# Altium footprint library FOOTPRINT.PcbLib: 132 footprints (part 3 of 9)
Each footprint in its own frame and in the unit in brackets; x right, y up, seen from the top. Pads: shape width x height; smd on the part's side, far side on the other; paste and mask are expansions set on the pad; w line width, h text height; cw(c..) or ccw(c..) is an arc to the next point about the centre after c.
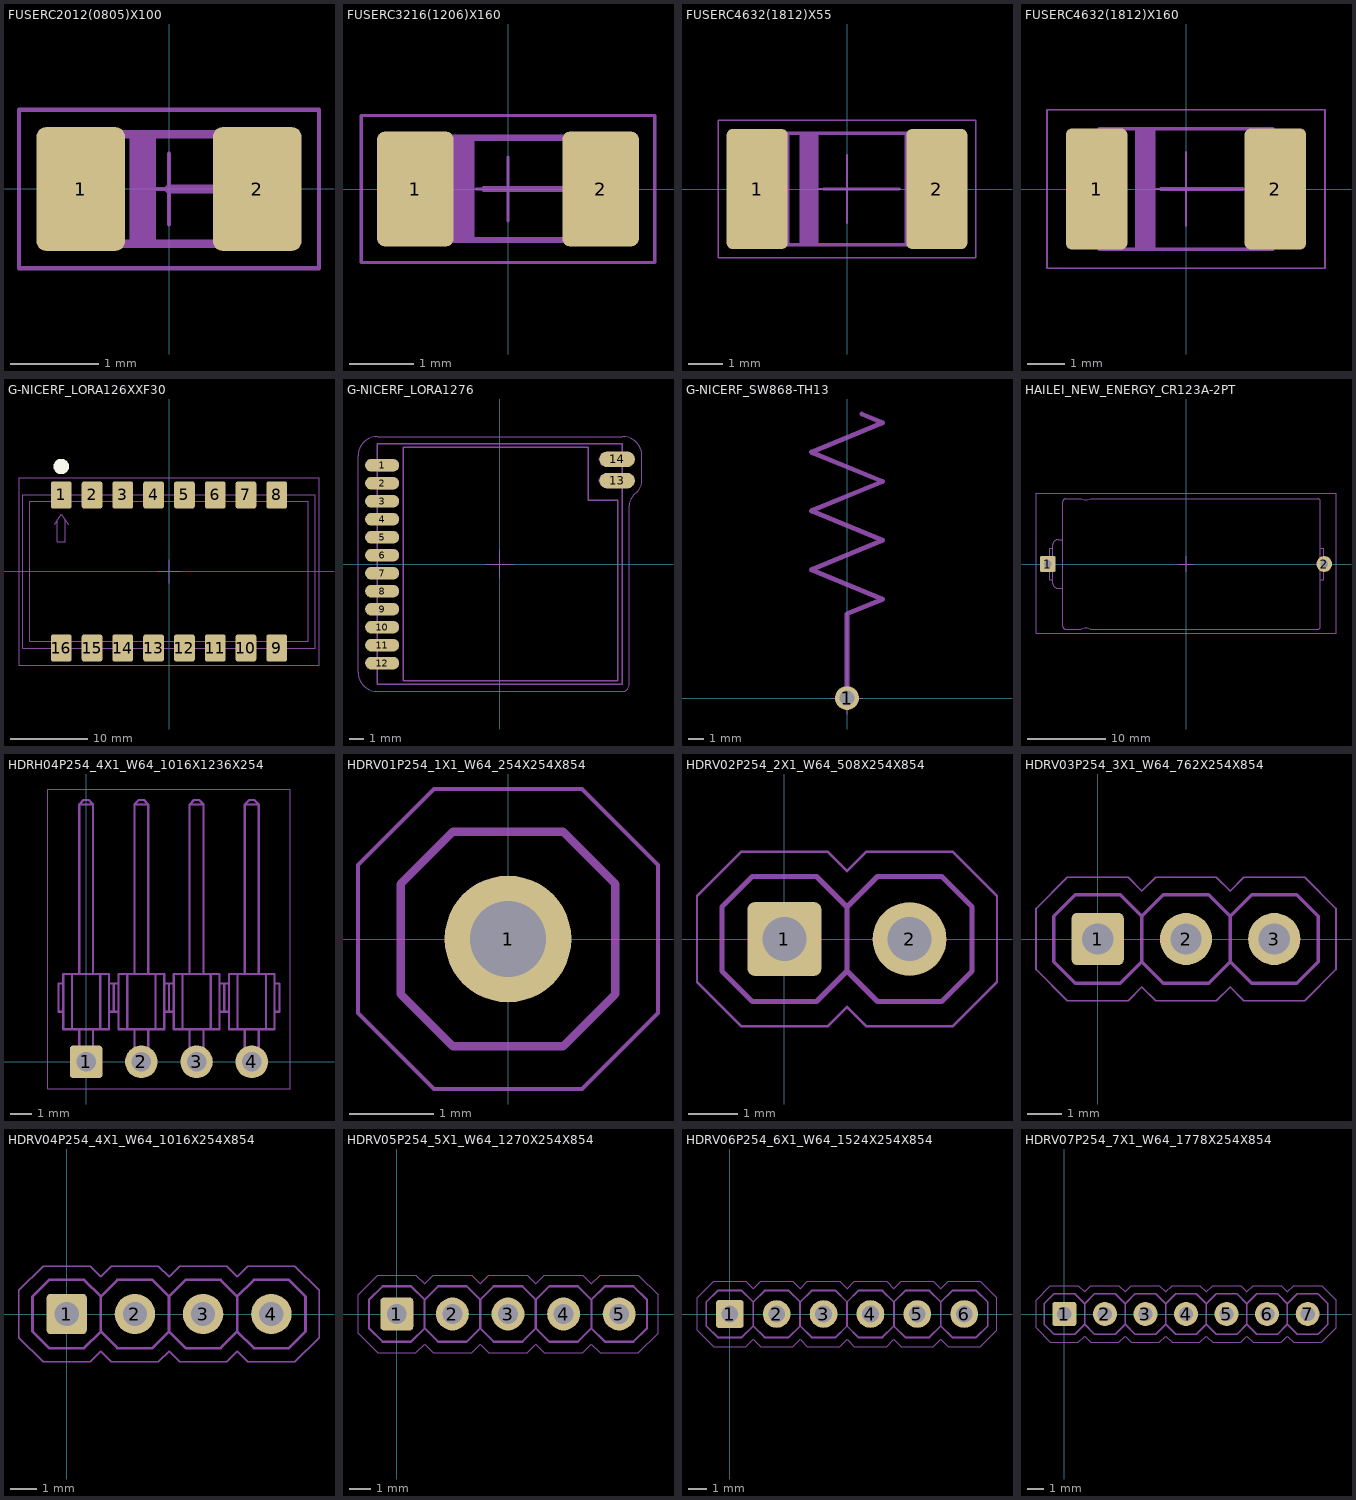
[diagram p2: the footprints below, top view; thin cyan lines are the x and y axes]

## FUSERC2012(0805)X100 [mm] "Fuse Resettable, Body 2.00x1.20mm"
height 1
pads (2):
  rrect20% 1x1.4 smd: 1(-1,0) 2(1,0)
Top Assembly:
  region: 1.02,0.62 0.65,0.62 0.65,-0.62 1.02,-0.62
  rectangle: -1.02,-0.62 -0.65,0.62
  rectangle: -0.45,-0.625 -0.15,0.62
  lines w0.1: 0,0 0.5,0 ; -1.02,-0.62 1.02,-0.62 1.02,0.62 -1.02,0.62 -1.02,-0.62
Top Courtyard:
  lines w0.05: -1.7,-0.9 1.7,-0.9 1.7,0.9 -1.7,0.9 -1.7,-0.9
Top Component Center:
  lines w0.05: -0.4,0 0.4,0 -0.4,0 ; 0,-0.4 0,0.4 0,-0.4
Top Designator:
  text "'.Designator'" at -0.55,0.126 h0.65
  text "'.Comment'" at -0.55,-0.535 h0.65
3D body "FUSERC_FUSERC2012(0805)X100.x_t": height 1.02, standoff -0.02, extent -1.02,-0.62 1.02,0.62

## FUSERC3216(1206)X160 [mm] "Fuse Resettable, Body 3.20x1.60mm"
height 1.6
pads (2):
  rrect20% 1.2x1.8 smd: 1(-1.45,0) 2(1.45,0)
Top Assembly:
  region: 1.6,0.8 1.15,0.8 1.15,-0.8 1.6,-0.8
  region: -1.15,0.8 -1.6,0.8 -1.6,-0.8 -1.15,-0.8
  rectangle: -0.875,-0.8 -0.525,0.8
  lines w0.1: -0.375,0 1,0 ; -1.6,-0.8 -1.6,0.8 1.6,0.8 1.6,-0.8 -1.6,-0.8
Top Courtyard:
  lines w0.05: -2.3,-1.15 -2.3,1.15 2.3,1.15 2.3,-1.15 -2.3,-1.15
Top Component Center:
  lines w0.05: -0.5,0 0.5,0 ; 0,-0.5 0,0.5
Top Designator:
  text "'.Designator'" at -0.5,0.076 h0.65
  text "'.Comment'" at -0.45,-0.66 h0.65
3D body "FUSERC_FUSERC3216(1206)X160.x_t": height 1.62, standoff -0.02, extent -1.62,-0.82 1.62,0.82

## FUSERC4632(1812)X55 [mm] "Fuse Resettable, Body 4.60x3.20mm"
height 0.55
pads (2):
  rrect20% 1.78x3.5 smd: 1(-2.615,0) 2(2.615,0)
Top Assembly:
  region: 2.32,1.62 1.675,1.62 1.675,-1.62 2.32,-1.62
  region: -1.675,1.62 -2.32,1.62 -2.32,-1.62 -1.675,-1.62
  rectangle: -1.375,-1.62 -0.825,1.625
  lines w0.1: -0.675,0 1.525,0 ; -2.32,-1.62 -2.32,1.62 2.32,1.62 2.32,-1.62 -2.32,-1.62
Top Courtyard:
  lines w0.05: -3.75,-2 3.75,-2 3.75,2 -3.75,2 -3.75,-2
Top Component Center:
  lines w0.05: -1,0 1,0 ; 0,-1 0,1
Top Designator:
  text "'.Comment'" at -0.725,-0.635 h0.65
  text "'.Designator'" at -0.725,0.276 h0.65
3D body "FUSERC_FUSERC4632(1812)X55.x_t": height 0.57, standoff -0.02, extent -2.32,-1.62 2.32,1.62

## FUSERC4632(1812)X160 [mm] "Fuse Resettable, Body 4.60x3.20mm"
height 1.6
pads (2):
  rrect20% 1.65x3.25 smd: 1(-2.4,0) 2(2.4,0)
Top Assembly:
  rectangle: -1.375,-1.62 -0.825,1.625
  region: -1.675,1.62 -2.32,1.62 -2.32,-1.62 -1.675,-1.62
  region: 2.32,1.62 1.675,1.62 1.675,-1.62 2.32,-1.62
  lines w0.1: -0.675,0 1.525,0 ; -2.32,-1.62 -2.32,1.62 2.32,1.62 2.32,-1.62 -2.32,-1.62
Top Courtyard:
  lines w0.05: -3.725,-2.125 3.725,-2.125 3.725,2.125 -3.725,2.125 -3.725,-2.125
Top Component Center:
  lines w0.05: -1,0 1,0 ; 0,-1 0,1
Top Designator:
  text "'.Comment'" at -0.975,-0.635 h0.65
  text "'.Designator'" at -0.975,0.276 h0.65
3D body "FUSERC_FUSERC4632(1812)X160.x_t": height 1.65, standoff 0.01, extent -2.32,-1.62 2.32,1.62

## G-NICERF_LORA126XXF30 [mm] "RF-Module, Body 38.0x20.0mm"
pads (16):
  rrect20% 2.7x3.5 smd: 1(-14,9.95) 2(-10,9.95) 3(-6,9.95) 4(-2,9.95) 5(2,9.95) 6(6,9.95) 7(10,9.95) 8(14,9.95) 9(14,-9.95) 10(10,-9.95) 11(6,-9.95) 12(2,-9.95) 13(-2,-9.95) 14(-6,-9.95) 15(-10,-9.95) 16(-14,-9.95)
Top Overlay:
  circle w1: c-14,13.65 r0.5
Top Assembly:
  lines w0.1: -14.875,6.125 -14,7.45 -13.125,6.125 ; -14.5,6.7 -14.5,3.85 -13.5,3.85 -13.5,6.7 ; -19,-10 19,-10 19,10 -19,10 -19,-10 ; -18.1,-9.1 18.1,-9.1 18.1,9.1 -18.1,9.1 -18.1,-9.1
Top Courtyard:
  lines w0.05: -19.5,-12.2 -15.35,-12.2 19.5,-12.2 19.5,-10 19.5,12.2 -19.5,12.2 -19.5,-10 -19.5,-12.2
Top Component Center:
  lines w0.05: -1.5,0 1.5,0 ; 0,-1.5 0,1.5
Top Designator:
  text "'.Designator'" at -1.6,0.176 h0.65
  text "'.Comment'" at -1.6,-0.435 h0.65
3D body: height 0.95, standoff 0, extent -19,-10 19,10
3D body: height 4, standoff 0.95, extent -18.1,-9.1 18.1,9.1

## G-NICERF_LORA1276 [mm] "RF-Module, Body 17.0x17.3mm"
height 2.62
pads (14):
  oval 2.4x0.9 smd: 1(-8.3,6.97) 2(-8.3,5.7) 3(-8.3,4.43) 4(-8.3,3.16) 5(-8.3,1.89) 6(-8.3,0.62) 7(-8.3,-0.65) 8(-8.3,-1.92) 9(-8.3,-3.19) 10(-8.3,-4.46) 11(-8.3,-5.73) 12(-8.3,-7)
  oval 2.5x1.1 smd: 13(8.3,5.89) 14(8.3,7.39)
Top Assembly:
  circle w0.1: c7.625,5.9 r0.3
  circle w0.1: c-7.675,1.895 r0.206
  circle w0.1: c-7.675,-1.915 r0.206
  circle w0.1: c7.625,7.4 r0.3
  circle w0.1: c-7.675,6.975 r0.206
  circle w0.1: c-7.675,5.705 r0.206
  circle w0.1: c-7.675,4.435 r0.206
  circle w0.1: c-7.675,3.165 r0.206
  circle w0.1: c-7.675,0.625 r0.206
  circle w0.1: c-7.675,-0.645 r0.206
  circle w0.1: c-7.675,-3.185 r0.206
  circle w0.1: c-7.675,-4.455 r0.206
  circle w0.1: c-7.675,-5.725 r0.206
  circle w0.1: c-7.675,-6.995 r0.206
  lines w0.1: -8.65,-7.37 -7.525,-7.37 ccw(c-7.524,-6.995) -7.525,-6.62 -8.65,-6.62 ; -8.65,-6.1 -7.525,-6.1 ccw(c-7.524,-5.725) -7.525,-5.35 -8.65,-5.35 ; -8.65,-4.83 -7.525,-4.83 ccw(c-7.524,-4.455) -7.525,-4.08 -8.65,-4.08 ; -8.65,-3.56 -7.525,-3.56 ccw(c-7.524,-3.185) -7.525,-2.81 -8.65,-2.81 ; -8.65,-2.29 -7.525,-2.29 ccw(c-7.524,-1.915) -7.525,-1.54 -8.65,-1.54 ; -8.65,-1.02 -7.525,-1.02 ccw(c-7.524,-0.645) -7.525,-0.27 -8.65,-0.27 ; -8.65,0.25 -7.525,0.25 ccw(c-7.524,0.625) -7.525,1 -8.65,1 ; -8.65,1.52 -7.525,1.52 ccw(c-7.524,1.895) -7.525,2.27 -8.65,2.27 ; -8.65,2.79 -7.525,2.79 ccw(c-7.524,3.165) -7.525,3.54 -8.65,3.54 ; -8.65,4.06 -7.525,4.06 ccw(c-7.524,4.435) -7.525,4.81 -8.65,4.81 ; -8.65,5.33 -7.525,5.33 ccw(c-7.524,5.705) -7.525,6.08 -8.65,6.08 ; -8.65,6.6 -7.525,6.6 ccw(c-7.524,6.975) -7.525,7.35 -8.65,7.35 ; -8.633,-7.37 ccw(c-8.75,-6.995) -8.633,-6.62 ; -8.633,-6.1 ccw(c-8.75,-5.725) -8.633,-5.35 ; -8.633,-4.83 ccw(c-8.75,-4.455) -8.633,-4.08 ; -8.633,-3.56 ccw(c-8.75,-3.185) -8.633,-2.81 ; -8.633,-2.29 ccw(c-8.75,-1.915) -8.633,-1.54 ; -8.633,-1.02 ccw(c-8.75,-0.645) -8.633,-0.27 ; -8.633,0.25 ccw(c-8.75,0.625) -8.633,1 ; -8.633,1.52 ccw(c-8.75,1.895) -8.633,2.27 ; -8.633,2.79 ccw(c-8.75,3.165) -8.633,3.54 ; -8.633,4.06 ccw(c-8.75,4.435) -8.633,4.81 ; -8.633,5.33 ccw(c-8.75,5.705) -8.633,6.08 ; -8.633,6.6 ccw(c-8.75,6.975) -8.633,7.35 ; 8.603,5.424 cw(c8.75,5.895) 8.603,6.366 ; 8.603,6.924 cw(c8.75,7.395) 8.603,7.866 ; 8.65,5.42 7.525,5.42 cw(c7.523,5.895) 7.525,6.37 8.65,6.37 ; 8.65,6.92 7.525,6.92 cw(c7.523,7.395) 7.525,7.87 8.65,7.87 ; -8.65,-8.5 8.65,-8.5 8.65,8.5 -8.65,8.5 -8.65,-8.5 ; -6.8,-8.25 8.35,-8.25 8.35,4.5 6.25,4.5 6.25,8.25 -6.8,8.25 -6.8,-8.25
Top Courtyard:
  lines w0.05: 8.65,-9 -8.65,-9 cw(c-8.65,-7.65) -10,-7.65 -10,7.65 cw(c-8.65,7.65) -8.65,9 8.7,9 cw(c8.7,7.65) 10.05,7.65 10.05,5.875 cw(c9.028,5.873) 9.75,5.15 9.45,4.838 ccw(c10.165,4.117) 9.15,4.125 9.15,-8.5 cw(c8.65,-8.5) 8.65,-9
Top Component Center:
  lines w0.05: -1,0 1,0 ; 0,-1 0,1
Top Designator:
  text "'.Comment'" at -1.2,-0.977 h0.65
  text "'.Designator'" at -1.2,0.676 h0.65
3D body "G-NiceRF -  LoRa1276.x_t": height 2.63, standoff 0.01, extent -8.65,-8.5 8.65,8.5

## G-NICERF_SW868-TH13 [mm] "Antenna, 868MHz"
height 3.6
pads (1):
  round 1.5 hole 0.95: 1(0,0)
Top Assembly:
  lines w0.3: 0,0 0,5.3 2.25,6.225 -2.25,8.075 2.25,9.925 -2.25,11.775 2.25,13.625 -2.25,15.475 2.25,17.325 0.923,17.87
Top Component Center:
  lines w0.05: -1,0 1,0 ; 0,-1 0,1
Top Designator:
  text "'.Comment'" at 0.75,1.973 h0.65
  text "'.Designator'" at 0.75,3.626 h0.65
3D body "G-NiceRF SW868-TH13.STEP": height 4.58, standoff -2.98, extent -3.775,-0.425 3.775,17.885

## HAILEI_NEW_ENERGY_CR123A-2PT [mm] "Battery, CR123A, PTH Contacts, Body 36.0x16.6mm"
height 16.6
pads (2):
  rrect20% 2x2 hole 1: 1(-17.575,0)
  round 2 hole 1: 2(17.575,0)
Top Assembly:
  lines w0.1: -16.925,-2 -17.35,-2 -17.35,2 -16.925,2 ; -15.65,-3.1 -16.275,-3.1 cw(c-16.275,-2.45) -16.925,-2.45 -16.925,2.45 cw(c-16.275,2.45) -16.275,3.1 -15.65,3.1 ; -15.3,-8.3 cw(c-15.3,-7.95) -15.65,-7.95 -15.65,7.95 cw(c-15.3,7.95) -15.3,8.3 ; -15.3,-8.3 -13.35,-8.3 cw(c-12.75,-9.677) -12.15,-8.3 16.75,-8.3 ; -15.3,-8.3 -15.3,-8.3 ; -15.3,8.3 -13.35,8.3 ccw(c-12.75,9.677) -12.15,8.3 ; -15.3,8.3 -15.3,8.3 ; -12.15,8.3 16.75,8.3 cw(c16.75,7.95) 17.1,7.95 17.1,2 ; -12.15,8.3 -12.15,8.3 ; 16.75,-8.3 ccw(c16.75,-7.95) 17.1,-7.95 17.1,-2 ; 16.75,-8.3 16.75,-8.3 ; 17.1,-2 17.1,2 ; 17.1,-2 17.525,-2 17.525,2 17.1,2
Top Courtyard:
  lines w0.05: -19.075,-8.8 -19.075,9 19.075,9 19.075,-8.8 -19.075,-8.8
Top Component Center:
  lines w0.05: -1,0 1,0 ; 0,-1 0,1
Top Designator:
  text "'.Designator'" at -1.425,0.351 h0.65
  text "'.Comment'" at -1.425,-0.803 h0.65
3D body "Hailei New Energy -CR123A-2PT.x_t": height 16.6, standoff -4.7, extent -18,-8.3 18.001,8.3

## HDRH04P254_4X1_W64_1016X1236X254 [mm] "PLS-04, Right Angle, 2.54mm, 1 Row, Body 10.16x12.36mm, Lead Width 0.64mm"
height 2.54
pads (4):
  rrect20% 1.5x1.5 hole 0.9: 1(0,0)
  round 1.5 hole 0.9: 2(2.54,0) 3(5.08,0) 4(7.62,0)
Top Assembly:
  lines w0.1: -1.05,2.3 -1.27,2.3 -1.27,3.6 -1.05,3.6 ; -0.65,1.5 -0.65,4.04 ; -0.32,0.64 0.32,0.64 ; -0.32,1.5 -0.32,-0.32 0.32,-0.32 0.32,1.5 ; -0.32,4.04 -0.32,11.84 ; 0.32,4.04 0.32,11.84 ; 0.65,1.5 0.65,4.04 ; 1.05,2.3 1.27,2.3 ; 1.05,3.6 1.27,3.6 ; 1.49,2.3 1.27,2.3 ; 1.49,3.6 1.27,3.6 ; 1.89,1.5 1.89,4.04 ; 2.22,0.64 2.86,0.64 ; 2.22,1.5 2.22,-0.32 2.86,-0.32 2.86,1.5 ; 2.22,4.04 2.22,11.84 ; 2.86,4.04 2.86,11.84 ; 3.19,1.5 3.19,4.04 ; 3.59,2.3 3.81,2.3 ; 3.59,3.6 3.81,3.6 ; 4.03,2.3 3.81,2.3 ; 4.03,3.6 3.81,3.6 ; 4.43,1.5 4.43,4.04 ; 4.76,0.64 5.4,0.64 ; 4.76,1.5 4.76,-0.32 5.4,-0.32 5.4,1.5 ; 4.76,4.04 4.76,11.84 ; 5.4,4.04 5.4,11.84 ; 5.73,1.5 5.73,4.04 ; 6.13,2.3 6.35,2.3 ; 6.13,3.6 6.35,3.6 ; 6.57,2.3 6.35,2.3 ; 6.57,3.6 6.35,3.6 ; 6.97,1.5 6.97,4.04 ; 7.3,0.64 7.94,0.64 ; 7.3,1.5 7.3,-0.32 7.94,-0.32 7.94,1.5 ; 7.3,4.04 7.3,11.84 ; 7.94,4.04 7.94,11.84 ; 8.27,1.5 8.27,4.04 ; 8.67,2.3 8.89,2.3 8.89,3.6 8.67,3.6 ; -0.32,11.84 -0.12,12.04 0.12,12.04 0.32,11.84 ; -0.32,11.84 0.32,11.84 ; 1.27,2.3 1.27,3.6 ; 2.22,11.84 2.42,12.04 2.66,12.04 2.86,11.84 ; 2.22,11.84 2.86,11.84 ; 3.81,2.3 3.81,3.6 ; 4.76,11.84 4.96,12.04 5.2,12.04 5.4,11.84 ; 4.76,11.84 5.4,11.84 ; 6.35,2.3 6.35,3.6 ; 7.3,11.84 7.5,12.04 7.74,12.04 7.94,11.84 ; 7.3,11.84 7.94,11.84 ; -1.05,1.5 -1.05,4.04 1.05,4.04 1.05,1.5 -1.05,1.5 ; 1.49,1.5 1.49,4.04 3.59,4.04 3.59,1.5 1.49,1.5 ; 4.03,1.5 4.03,4.04 6.13,4.04 6.13,1.5 4.03,1.5 ; 6.57,1.5 6.57,4.04 8.67,4.04 8.67,1.5 6.57,1.5
Top Courtyard:
  lines w0.05: -1.775,-1.25 -1.775,12.55 9.4,12.55 9.4,-1.25 -1.775,-1.25
Top Component Center:
  lines w0.05: -0.5,0 0.5,0 ; 0,-0.5 0,0.5
Top Designator:
  text "'.Designator'" at 1.092,5.36 h0.65
  text "'.Comment'" at 1.795,5.36 h0.65
3D body "PLS_PLS-01R.x_t": height 2.55, standoff -2.99, extent -1.27,-0.32 1.27,12.04
3D body "PLS_PLS-01R.x_t": height 2.55, standoff -2.99, extent 1.27,-0.32 3.81,12.04
3D body "PLS_PLS-01R.x_t": height 2.55, standoff -2.99, extent 3.81,-0.32 6.35,12.04
3D body "PLS_PLS-01R.x_t": height 2.55, standoff -2.99, extent 6.35,-0.32 8.89,12.04

## HDRV01P254_1X1_W64_254X254X854 [mm] "PLS-01, 2.54mm, 1 Row, Body 2.54x2.54mm, Lead Width 0.64mm"
height 8.54
pads (1):
  round 1.5 hole 0.9: 1(0,0)
Top Assembly:
  lines w0.1: -1.27,-0.65 -1.27,0.65 -0.65,1.27 0.65,1.27 1.27,0.65 1.27,-0.65 0.65,-1.27 -0.65,-1.27 -1.27,-0.65 ; -0.325,-0.325 0.325,-0.325 0.325,0.325 -0.325,0.325 -0.325,-0.325
Top Courtyard:
  lines w0.05: -1.775,-0.875 -1.775,0.875 -0.875,1.775 0.875,1.775 1.775,0.875 1.775,-0.875 0.875,-1.775 -0.875,-1.775 -1.775,-0.875
Top Component Center:
  lines w0.05: -0.5,0 0.5,0 ; 0,-0.5 0,0.5
Top Designator:
  text "'.Comment'" at 1.4,-0.552 h0.65
  text "'.Designator'" at 1.4,0.151 h0.65
3D body "PLS_PLS-01.x_t": height 8.55, standoff -2.99, extent -1.27,-1.27 1.27,1.27

## HDRV02P254_2X1_W64_508X254X854 [mm] "PLS-02, 2.54mm, 1 Row, Body 5.08x2.54mm, Lead Width 0.64mm"
height 8.54
pads (2):
  rrect20% 1.5x1.5 hole 0.9: 1(0,0)
  round 1.5 hole 0.9: 2(2.54,0)
Top Assembly:
  lines w0.1: 1.27,-0.65 1.27,0.65 ; 1.27,-0.65 1.89,-1.27 3.19,-1.27 3.81,-0.65 3.81,0.65 3.19,1.27 1.89,1.27 1.27,0.65 ; 1.27,-0.65 0.65,-1.27 -0.65,-1.27 -1.27,-0.65 -1.27,0.65 -0.65,1.27 0.65,1.27 1.27,0.65 ; -0.325,-0.325 0.325,-0.325 0.325,0.325 -0.325,0.325 -0.325,-0.325 ; 2.215,-0.325 2.215,0.325 2.865,0.325 2.865,-0.325 2.215,-0.325
Top Courtyard:
  lines w0.05: -1.775,-0.875 -1.775,0.875 -0.875,1.775 0.875,1.775 1.27,1.38 1.665,1.775 3.415,1.775 4.315,0.875 4.315,-0.875 3.415,-1.775 1.665,-1.775 1.27,-1.38 0.875,-1.775 -0.875,-1.775 -1.775,-0.875
Top Component Center:
  lines w0.05: -0.5,0 0.5,0 ; 0,-0.5 0,0.5
Top Designator:
  text "'.Comment'" at 3.94,-0.552 h0.65
  text "'.Designator'" at 3.94,0.151 h0.65
3D body "PLS_PLS-02.x_t": height 8.54, standoff -3, extent -1.27,-1.27 3.81,1.27

## HDRV03P254_3X1_W64_762X254X854 [mm] "PLS-03, 2.54mm, 1 Row, Body 7.62x2.54mm, Lead Width 0.64mm"
height 8.54
pads (3):
  rrect20% 1.5x1.5 hole 0.9: 1(0,0)
  round 1.5 hole 0.9: 2(2.54,0) 3(5.08,0)
Top Assembly:
  lines w0.1: 1.27,-0.65 1.27,0.65 ; 1.27,-0.65 1.89,-1.27 3.19,-1.27 3.81,-0.65 ; 1.27,-0.65 0.65,-1.27 -0.65,-1.27 -1.27,-0.65 -1.27,0.65 -0.65,1.27 0.65,1.27 1.27,0.65 ; 1.27,0.65 1.89,1.27 3.19,1.27 3.81,0.65 ; 3.81,-0.65 4.43,-1.27 5.73,-1.27 6.35,-0.65 6.35,0.65 5.73,1.27 4.43,1.27 3.81,0.65 ; 3.81,-0.65 3.81,0.65 ; -0.325,-0.325 0.325,-0.325 0.325,0.325 -0.325,0.325 -0.325,-0.325 ; 2.215,-0.325 2.865,-0.325 2.865,0.325 2.215,0.325 2.215,-0.325 ; 4.755,-0.325 4.755,0.325 5.405,0.325 5.405,-0.325 4.755,-0.325
Top Courtyard:
  lines w0.05: -1.775,-0.875 -1.775,0.875 -0.875,1.775 0.875,1.775 1.27,1.38 1.665,1.775 3.415,1.775 3.81,1.38 4.205,1.775 5.955,1.775 6.855,0.875 6.855,-0.875 5.955,-1.775 4.205,-1.775 3.81,-1.38 3.415,-1.775 1.665,-1.775 1.27,-1.38 0.875,-1.775 -0.875,-1.775 -1.775,-0.875
Top Component Center:
  lines w0.05: -0.5,0 0.5,0 ; 0,-0.5 0,0.5
Top Designator:
  text "'.Comment'" at -1.14,1.48 h0.65
  text "'.Designator'" at -1.14,2.183 h0.65
3D body "PLS_PLS-03.x_t": height 8.55, standoff -2.99, extent -1.27,-1.27 6.35,1.27

## HDRV04P254_4X1_W64_1016X254X854 [mm] "PLS-04, 2.54mm, 1 Row, Body 10.16x2.54mm, Lead Width 0.64mm"
height 8.54
pads (4):
  rrect20% 1.5x1.5 hole 0.9: 1(0,0)
  round 1.5 hole 0.9: 2(2.54,0) 3(5.08,0) 4(7.62,0)
Top Assembly:
  lines w0.1: 1.27,-0.65 0.65,-1.27 -0.65,-1.27 -1.27,-0.65 -1.27,0.65 -0.65,1.27 0.65,1.27 1.27,0.65 ; 1.27,-0.65 1.89,-1.27 3.19,-1.27 3.81,-0.65 ; 1.27,-0.65 1.27,0.65 ; 1.27,0.65 1.89,1.27 3.19,1.27 3.81,0.65 ; 3.81,-0.65 3.81,0.65 ; 3.81,-0.65 4.43,-1.27 5.73,-1.27 6.35,-0.65 ; 3.81,0.65 4.43,1.27 5.73,1.27 6.35,0.65 ; 6.35,-0.65 6.35,0.65 ; 6.35,-0.65 6.97,-1.27 8.27,-1.27 8.89,-0.65 8.89,0.65 8.27,1.27 6.97,1.27 6.35,0.65 ; -0.325,-0.325 -0.325,0.325 0.325,0.325 0.325,-0.325 -0.325,-0.325 ; 2.215,-0.325 2.865,-0.325 2.865,0.325 2.215,0.325 2.215,-0.325 ; 4.755,-0.325 5.405,-0.325 5.405,0.325 4.755,0.325 4.755,-0.325 ; 7.295,-0.325 7.295,0.325 7.945,0.325 7.945,-0.325 7.295,-0.325
Top Courtyard:
  lines w0.05: -1.775,-0.875 -0.875,-1.775 0.875,-1.775 1.27,-1.38 1.665,-1.775 3.415,-1.775 3.81,-1.38 4.205,-1.775 5.955,-1.775 6.35,-1.38 6.745,-1.775 8.495,-1.775 9.395,-0.875 9.395,0.875 8.495,1.775 6.745,1.775 6.35,1.38 5.955,1.775 4.205,1.775 3.81,1.38 3.415,1.775 1.665,1.775 1.27,1.38 0.875,1.775 -0.875,1.775 -1.775,0.875 -1.775,-0.875
Top Component Center:
  lines w0.05: -0.5,0 0.5,0 ; 0,-0.5 0,0.5
Top Designator:
  text "'.Designator'" at -1.14,2.183 h0.65
  text "'.Comment'" at -1.14,1.48 h0.65
3D body "PLS_PLS-04.x_t": height 8.54, standoff -3, extent -1.27,-1.27 8.89,1.27

## HDRV05P254_5X1_W64_1270X254X854 [mm] "PLS-05, 2.54mm, 1 Row, Body 12.70x2.54mm, Lead Width 0.64mm"
height 8.54
pads (5):
  rrect20% 1.5x1.5 hole 0.9: 1(0,0)
  round 1.5 hole 0.9: 2(2.54,0) 3(5.08,0) 4(7.62,0) 5(10.16,0)
Top Assembly:
  lines w0.1: 1.27,-0.65 1.27,0.65 ; 1.27,-0.65 1.89,-1.27 3.19,-1.27 3.81,-0.65 ; 1.27,-0.65 0.65,-1.27 -0.65,-1.27 -1.27,-0.65 -1.27,0.65 -0.65,1.27 0.65,1.27 1.27,0.65 ; 1.27,0.65 1.89,1.27 3.19,1.27 3.81,0.65 ; 3.81,-0.65 4.43,-1.27 5.73,-1.27 6.35,-0.65 ; 3.81,-0.65 3.81,0.65 ; 3.81,0.65 4.43,1.27 5.73,1.27 6.35,0.65 ; 6.35,-0.65 6.97,-1.27 8.27,-1.27 8.89,-0.65 ; 6.35,-0.65 6.35,0.65 ; 6.35,0.65 6.97,1.27 8.27,1.27 8.89,0.65 ; 8.89,-0.65 9.51,-1.27 10.81,-1.27 11.43,-0.65 11.43,0.65 10.81,1.27 9.51,1.27 8.89,0.65 ; 8.89,-0.65 8.89,0.65 ; -0.325,-0.325 0.325,-0.325 0.325,0.325 -0.325,0.325 -0.325,-0.325 ; 2.215,-0.325 2.215,0.325 2.865,0.325 2.865,-0.325 2.215,-0.325 ; 4.755,-0.325 5.405,-0.325 5.405,0.325 4.755,0.325 4.755,-0.325 ; 7.295,-0.325 7.945,-0.325 7.945,0.325 7.295,0.325 7.295,-0.325 ; 9.835,-0.325 9.835,0.325 10.485,0.325 10.485,-0.325 9.835,-0.325
Top Courtyard:
  lines w0.05: -1.775,-0.875 -1.775,0.875 -0.875,1.775 0.875,1.775 1.27,1.38 1.665,1.775 3.415,1.775 3.81,1.38 4.205,1.775 5.955,1.775 6.35,1.38 6.745,1.775 8.495,1.775 8.89,1.38 9.285,1.775 11.035,1.775 11.935,0.875 11.935,-0.875 11.035,-1.775 9.285,-1.775 8.89,-1.38 8.495,-1.775 6.745,-1.775 6.35,-1.38 5.955,-1.775 4.205,-1.775 3.81,-1.38 3.415,-1.775 1.665,-1.775 1.27,-1.38 0.875,-1.775 -0.875,-1.775 -1.775,-0.875
Top Component Center:
  lines w0.05: -0.5,0 0.5,0 ; 0,-0.5 0,0.5
Top Designator:
  text "'.Comment'" at -1.14,1.48 h0.65
  text "'.Designator'" at -1.14,2.183 h0.65
3D body "PLS_PLS-05.x_t": height 8.54, standoff -3, extent -1.27,-1.27 11.43,1.27

## HDRV06P254_6X1_W64_1524X254X854 [mm] "PLS-06, 2.54mm, 1 Row, Body 15.24x2.54mm, Lead Width 0.64mm"
height 8.54
pads (6):
  rrect20% 1.5x1.5 hole 0.9: 1(0,0)
  round 1.5 hole 0.9: 2(2.54,0) 3(5.08,0) 4(7.62,0) 5(10.16,0) 6(12.7,0)
Top Assembly:
  lines w0.1: 1.27,-0.65 1.27,0.65 ; 1.27,-0.65 1.89,-1.27 3.19,-1.27 3.81,-0.65 ; 1.27,-0.65 0.65,-1.27 -0.65,-1.27 -1.27,-0.65 -1.27,0.65 -0.65,1.27 0.65,1.27 1.27,0.65 ; 1.27,0.65 1.89,1.27 3.19,1.27 3.81,0.65 ; 3.81,-0.65 4.43,-1.27 5.73,-1.27 6.35,-0.65 ; 3.81,-0.65 3.81,0.65 ; 3.81,0.65 4.43,1.27 5.73,1.27 6.35,0.65 ; 6.35,-0.65 6.97,-1.27 8.27,-1.27 8.89,-0.65 ; 6.35,-0.65 6.35,0.65 ; 6.35,0.65 6.97,1.27 8.27,1.27 8.89,0.65 ; 8.89,-0.65 9.51,-1.27 10.81,-1.27 11.43,-0.65 ; 8.89,-0.65 8.89,0.65 ; 8.89,0.65 9.51,1.27 10.81,1.27 11.43,0.65 ; 11.43,-0.65 12.05,-1.27 13.35,-1.27 13.97,-0.65 13.97,0.65 13.35,1.27 12.05,1.27 11.43,0.65 ; 11.43,-0.65 11.43,0.65 ; -0.325,-0.325 0.325,-0.325 0.325,0.325 -0.325,0.325 -0.325,-0.325 ; 2.215,-0.325 2.215,0.325 2.865,0.325 2.865,-0.325 2.215,-0.325 ; 4.755,-0.325 5.405,-0.325 5.405,0.325 4.755,0.325 4.755,-0.325 ; 7.295,-0.325 7.295,0.325 7.945,0.325 7.945,-0.325 7.295,-0.325 ; 9.835,-0.325 9.835,0.325 10.485,0.325 10.485,-0.325 9.835,-0.325 ; 12.375,-0.325 13.025,-0.325 13.025,0.325 12.375,0.325 12.375,-0.325
Top Courtyard:
  lines w0.05: -1.775,-0.875 -1.775,0.875 -0.875,1.775 0.875,1.775 1.27,1.38 1.665,1.775 3.415,1.775 3.81,1.38 4.205,1.775 5.955,1.775 6.35,1.38 6.745,1.775 8.495,1.775 8.89,1.38 9.285,1.775 11.035,1.775 11.43,1.38 11.825,1.775 13.575,1.775 14.475,0.875 14.475,-0.875 13.575,-1.775 11.825,-1.775 11.43,-1.38 11.035,-1.775 9.285,-1.775 8.89,-1.38 8.495,-1.775 6.745,-1.775 6.35,-1.38 5.955,-1.775 4.205,-1.775 3.81,-1.38 3.415,-1.775 1.665,-1.775 1.27,-1.38 0.875,-1.775 -0.875,-1.775 -1.775,-0.875
Top Component Center:
  lines w0.05: -0.5,0 0.5,0 ; 0,-0.5 0,0.5
Top Designator:
  text "'.Comment'" at -1.14,1.48 h0.65
  text "'.Designator'" at -1.14,2.183 h0.65
3D body "PLS_PLS-06.x_t": height 8.54, standoff -3, extent -1.27,-1.27 13.97,1.27

## HDRV07P254_7X1_W64_1778X254X854 [mm] "PLS-07, 2.54mm, 1 Row, Body 17.78x2.54mm, Lead Width 0.64mm"
height 8.54
pads (7):
  rrect20% 1.5x1.5 hole 0.9: 1(0,0)
  round 1.5 hole 0.9: 2(2.54,0) 3(5.08,0) 4(7.62,0) 5(10.16,0) 6(12.7,0) 7(15.24,0)
Top Assembly:
  lines w0.1: 1.27,-0.65 0.65,-1.27 -0.65,-1.27 -1.27,-0.65 -1.27,0.65 -0.65,1.27 0.65,1.27 1.27,0.65 ; 1.27,-0.65 1.89,-1.27 3.19,-1.27 3.81,-0.65 ; 1.27,-0.65 1.27,0.65 ; 1.27,0.65 1.89,1.27 3.19,1.27 3.81,0.65 ; 3.81,-0.65 3.81,0.65 ; 3.81,-0.65 4.43,-1.27 5.73,-1.27 6.35,-0.65 ; 3.81,0.65 4.43,1.27 5.73,1.27 6.35,0.65 ; 6.35,-0.65 6.35,0.65 ; 6.35,-0.65 6.97,-1.27 8.27,-1.27 8.89,-0.65 ; 6.35,0.65 6.97,1.27 8.27,1.27 8.89,0.65 ; 8.89,-0.65 8.89,0.65 ; 8.89,-0.65 9.51,-1.27 10.81,-1.27 11.43,-0.65 ; 8.89,0.65 9.51,1.27 10.81,1.27 11.43,0.65 ; 11.43,-0.65 11.43,0.65 ; 11.43,-0.65 12.05,-1.27 13.35,-1.27 13.97,-0.65 ; 11.43,0.65 12.05,1.27 13.35,1.27 13.97,0.65 ; 13.97,-0.65 13.97,0.65 ; 13.97,-0.65 14.59,-1.27 15.89,-1.27 16.51,-0.65 16.51,0.65 15.89,1.27 14.59,1.27 13.97,0.65 ; -0.325,-0.325 -0.325,0.325 0.325,0.325 0.325,-0.325 -0.325,-0.325 ; 2.215,-0.325 2.215,0.325 2.865,0.325 2.865,-0.325 2.215,-0.325 ; 4.755,-0.325 5.405,-0.325 5.405,0.325 4.755,0.325 4.755,-0.325 ; 7.295,-0.325 7.295,0.325 7.945,0.325 7.945,-0.325 7.295,-0.325 ; 9.835,-0.325 10.485,-0.325 10.485,0.325 9.835,0.325 9.835,-0.325 ; 12.375,-0.325 13.025,-0.325 13.025,0.325 12.375,0.325 12.375,-0.325 ; 14.915,-0.325 14.915,0.325 15.565,0.325 15.565,-0.325 14.915,-0.325
Top Courtyard:
  lines w0.05: -1.775,-0.875 -0.875,-1.775 0.875,-1.775 1.27,-1.38 1.665,-1.775 3.415,-1.775 3.81,-1.38 4.205,-1.775 5.955,-1.775 6.35,-1.38 6.745,-1.775 8.495,-1.775 8.89,-1.38 9.285,-1.775 11.035,-1.775 11.43,-1.38 11.825,-1.775 13.575,-1.775 13.97,-1.38 14.365,-1.775 16.115,-1.775 17.015,-0.875 17.015,0.875 16.115,1.775 14.365,1.775 13.97,1.38 13.575,1.775 11.825,1.775 11.43,1.38 11.035,1.775 9.285,1.775 8.89,1.38 8.495,1.775 6.745,1.775 6.35,1.38 5.955,1.775 4.205,1.775 3.81,1.38 3.415,1.775 1.665,1.775 1.27,1.38 0.875,1.775 -0.875,1.775 -1.775,0.875 -1.775,-0.875
Top Component Center:
  lines w0.05: -0.5,0 0.5,0 ; 0,-0.5 0,0.5
Top Designator:
  text "'.Designator'" at -1.14,2.183 h0.65
  text "'.Comment'" at -1.14,1.48 h0.65
3D body "PLS_PLS-07.x_t": height 8.54, standoff -3, extent -1.27,-1.27 16.51,1.27